# Altium footprint library con-samtec.PCBLIB: 805 footprints (part 39 of 55)
Each footprint in its own frame and in the unit in brackets; x right, y up, seen from the top. Pads: shape width x height; smd on the part's side, far side on the other; paste and mask are expansions set on the pad; w line width, h text height; cw(c..) or ccw(c..) is an arc to the next point about the centre after c.
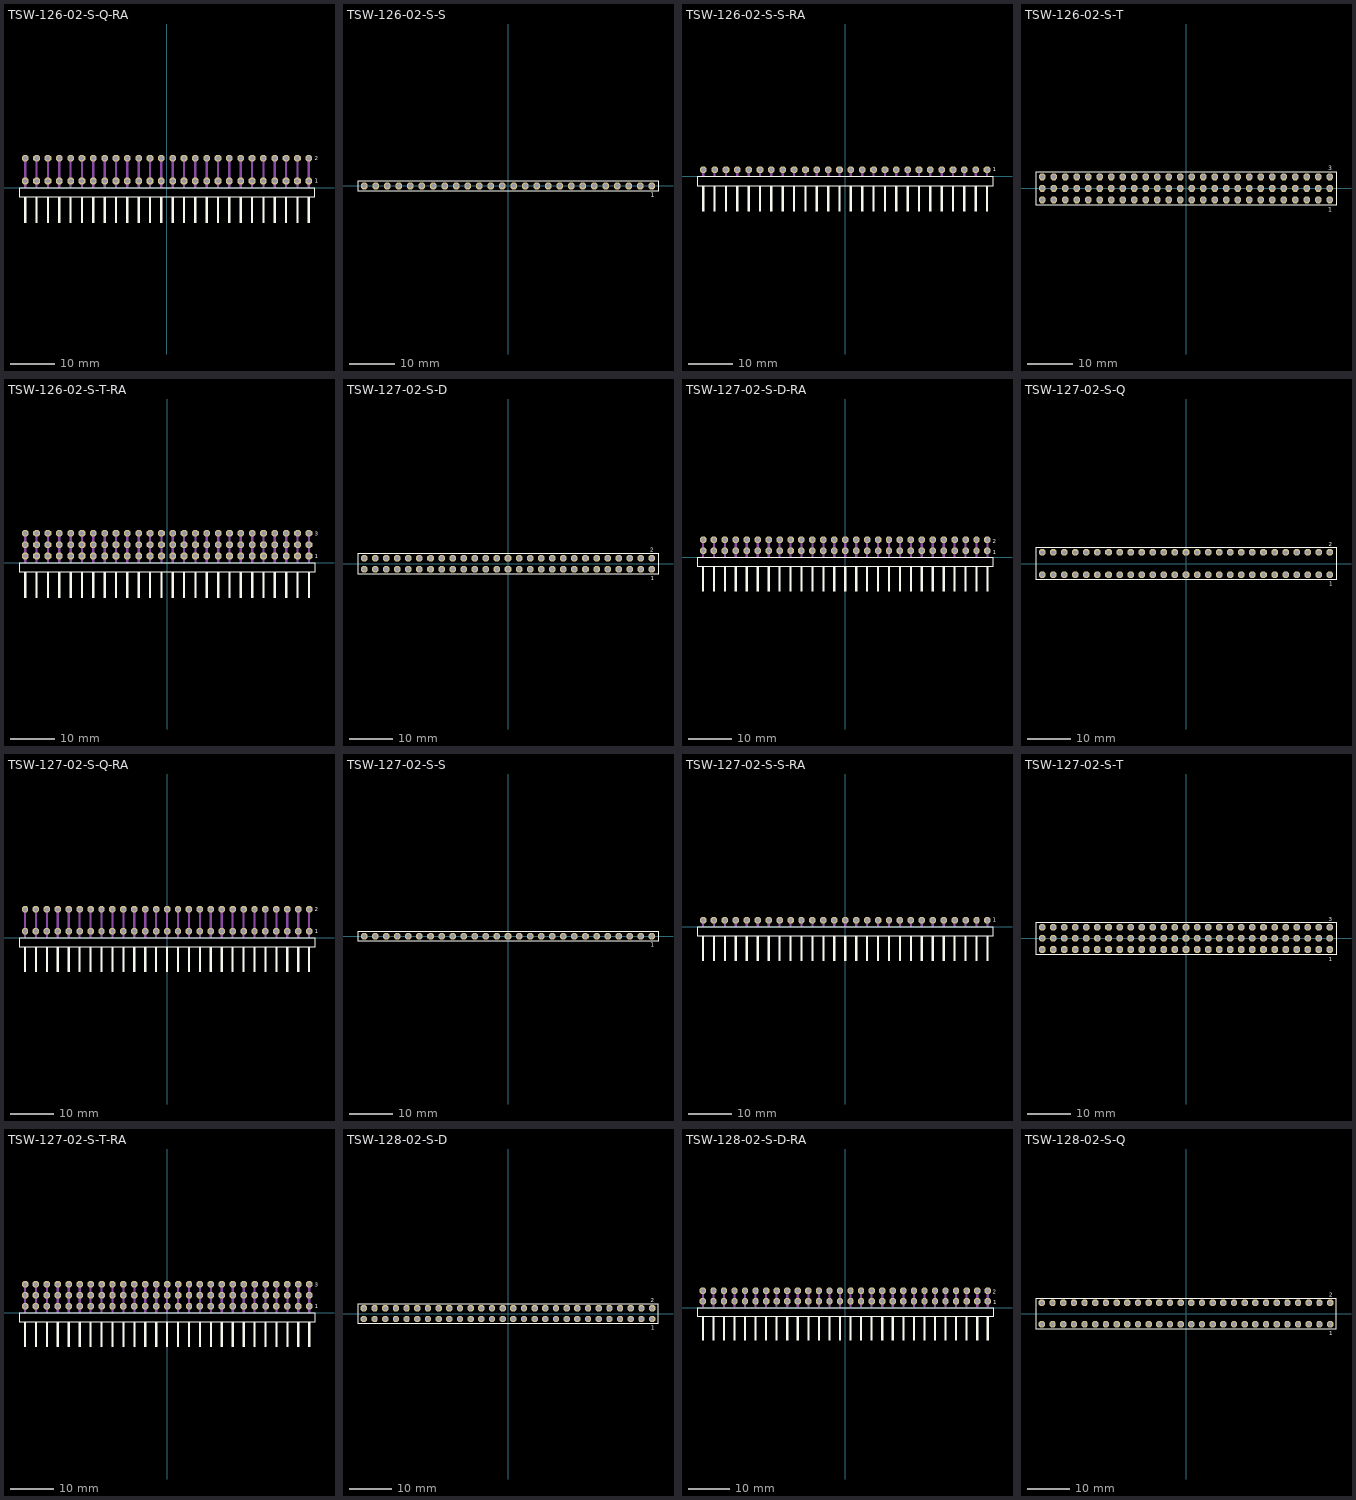
[diagram p38: the footprints below, top view; thin cyan lines are the x and y axes]

## TSW-126-02-S-Q-RA [mil]
pads (52):
  oct 59.06x59.06 hole 39.37: 1(1250,60) 2(1250,260) 3(1150,60) 4(1150,260) 5(1050,60) 6(1050,260) 7(950,60) 8(950,260) 9(850,60) 10(850,260) 11(750,60) 12(750,260) 13(650,60) 14(650,260) 15(550,60) 16(550,260) 17(450,60) 18(450,260) 19(350,60) 20(350,260) 21(250,60) 22(250,260) 23(150,60) 24(150,260) 25(50,60) 26(50,260) 27(-50,60) 28(-50,260) 29(-150,60) 30(-150,260) 31(-250,60) 32(-250,260) 33(-350,60) 34(-350,260) 35(-450,60) 36(-450,260) 37(-550,60) 38(-550,260) 39(-650,60) 40(-650,260) 41(-750,60) 42(-750,260) 43(-850,60) 44(-850,260) 45(-950,60) 46(-950,260) 47(-1050,60) 48(-1050,260) 49(-1150,60) 50(-1150,260) 51(-1250,60) 52(-1250,260)
Top Overlay:
  rectangle: -1260,-310.63 -1240,-80.32
  rectangle: -1160,-310.63 -1140,-80.32
  rectangle: -1060,-310.63 -1040,-80.32
  rectangle: -960,-310.63 -940,-80.32
  rectangle: -860,-310.63 -840,-80.32
  rectangle: -760,-310.63 -740,-80.32
  rectangle: -660,-310.63 -640,-80.32
  rectangle: -560,-310.63 -540,-80.32
  rectangle: -460,-310.63 -440,-80.32
  rectangle: -360,-310.63 -340,-80.32
  rectangle: -260,-310.63 -240,-80.32
  rectangle: -160,-310.63 -140,-80.32
  rectangle: -60,-310.63 -40,-80.32
  rectangle: 40,-310.63 60,-80.32
  rectangle: 140,-310.63 160,-80.32
  rectangle: 240,-310.63 260,-80.32
  rectangle: 340,-310.63 360,-80.32
  rectangle: 440,-310.63 460,-80.32
  rectangle: 540,-310.63 560,-80.32
  rectangle: 640,-310.63 660,-80.32
  rectangle: 740,-310.63 760,-80.32
  rectangle: 840,-310.63 860,-80.32
  rectangle: 940,-310.63 960,-80.32
  rectangle: 1040,-310.63 1060,-80.32
  rectangle: 1140,-310.63 1160,-80.32
  rectangle: 1240,-310.63 1260,-80.32
  lines w8: -1305.08,-80.55 1305.08,-80.55 1305.08,-4.17 -1305.08,-4.17 -1305.08,-80.55
  text "1" at 1303.54,43.31 h36.81
  text "2" at 1301.18,242.72 h36.81
Mechanical 16:
  rectangle: -1260,0 -1240,270
  rectangle: -1160,0 -1140,270
  rectangle: -1060,0 -1040,270
  rectangle: -960,0 -940,270
  rectangle: -860,0 -840,270
  rectangle: -760,0 -740,270
  rectangle: -660,0 -640,270
  rectangle: -560,0 -540,270
  rectangle: -460,0 -440,270
  rectangle: -360,0 -340,270
  rectangle: -260,0 -240,270
  rectangle: -160,0 -140,270
  rectangle: -60,0 -40,270
  rectangle: 40,0 60,270
  rectangle: 140,0 160,270
  rectangle: 240,0 260,270
  rectangle: 340,0 360,270
  rectangle: 440,0 460,270
  rectangle: 540,0 560,270
  rectangle: 640,0 660,270
  rectangle: 740,0 760,270
  rectangle: 840,0 860,270
  rectangle: 940,0 960,270
  rectangle: 1040,0 1060,270
  rectangle: 1140,0 1160,270
  rectangle: 1240,0 1260,270

## TSW-126-02-S-S [mm]
pads (26):
  oct 1.5x1.5 hole 1: 1(31.75,0) 2(29.21,0) 3(26.67,0) 4(24.13,0) 5(21.59,0) 6(19.05,0) 7(16.51,0) 8(13.97,0) 9(11.43,0) 10(8.89,0) 11(6.35,0) 12(3.81,0) 13(1.27,0) 14(-1.27,0) 15(-3.81,0) 16(-6.35,0) 17(-8.89,0) 18(-11.43,0) 19(-13.97,0) 20(-16.51,0) 21(-19.05,0) 22(-21.59,0) 23(-24.13,0) 24(-26.67,0) 25(-29.21,0) 26(-31.75,0)
Top Overlay:
  lines w0.203: -33.149,-1.155 33.149,-1.155 33.149,1.155 -33.149,1.155 -33.149,-1.155
  text "1" at 31.492,-2.498 h0.94
Mechanical 16:
  rectangle: -32.1,-0.35 -31.4,0.35
  rectangle: -29.56,-0.35 -28.86,0.35
  rectangle: -27.02,-0.35 -26.32,0.35
  rectangle: -24.48,-0.35 -23.78,0.35
  rectangle: -21.94,-0.35 -21.24,0.35
  rectangle: -19.4,-0.35 -18.7,0.35
  rectangle: -16.86,-0.35 -16.16,0.35
  rectangle: -14.32,-0.35 -13.62,0.35
  rectangle: -11.78,-0.35 -11.08,0.35
  rectangle: -9.24,-0.35 -8.54,0.35
  rectangle: -6.7,-0.35 -6,0.35
  rectangle: -4.16,-0.35 -3.46,0.35
  rectangle: -1.62,-0.35 -0.92,0.35
  rectangle: 0.92,-0.35 1.62,0.35
  rectangle: 3.46,-0.35 4.16,0.35
  rectangle: 6,-0.35 6.7,0.35
  rectangle: 8.54,-0.35 9.24,0.35
  rectangle: 11.08,-0.35 11.78,0.35
  rectangle: 13.62,-0.35 14.32,0.35
  rectangle: 16.16,-0.35 16.86,0.35
  rectangle: 18.7,-0.35 19.4,0.35
  rectangle: 21.24,-0.35 21.94,0.35
  rectangle: 23.78,-0.35 24.48,0.35
  rectangle: 26.32,-0.35 27.02,0.35
  rectangle: 28.86,-0.35 29.56,0.35
  rectangle: 31.4,-0.35 32.1,0.35

## TSW-126-02-S-S-RA [mil]
pads (26):
  oct 59.06x59.06 hole 39.37: 1(1250,60) 2(1150,60) 3(1050,60) 4(950,60) 5(850,60) 6(750,60) 7(650,60) 8(550,60) 9(450,60) 10(350,60) 11(250,60) 12(150,60) 13(50,60) 14(-50,60) 15(-150,60) 16(-250,60) 17(-350,60) 18(-450,60) 19(-550,60) 20(-650,60) 21(-750,60) 22(-850,60) 23(-950,60) 24(-1050,60) 25(-1150,60) 26(-1250,60)
Top Overlay:
  rectangle: -1260,-310.63 -1240,-80.32
  rectangle: -1160,-310.63 -1140,-80.32
  rectangle: -1060,-310.63 -1040,-80.32
  rectangle: -960,-310.63 -940,-80.32
  rectangle: -860,-310.63 -840,-80.32
  rectangle: -760,-310.63 -740,-80.32
  rectangle: -660,-310.63 -640,-80.32
  rectangle: -560,-310.63 -540,-80.32
  rectangle: -460,-310.63 -440,-80.32
  rectangle: -360,-310.63 -340,-80.32
  rectangle: -260,-310.63 -240,-80.32
  rectangle: -160,-310.63 -140,-80.32
  rectangle: -60,-310.63 -40,-80.32
  rectangle: 40,-310.63 60,-80.32
  rectangle: 140,-310.63 160,-80.32
  rectangle: 240,-310.63 260,-80.32
  rectangle: 340,-310.63 360,-80.32
  rectangle: 440,-310.63 460,-80.32
  rectangle: 540,-310.63 560,-80.32
  rectangle: 640,-310.63 660,-80.32
  rectangle: 740,-310.63 760,-80.32
  rectangle: 840,-310.63 860,-80.32
  rectangle: 940,-310.63 960,-80.32
  rectangle: 1040,-310.63 1060,-80.32
  rectangle: 1140,-310.63 1160,-80.32
  rectangle: 1240,-310.63 1260,-80.32
  lines w8: -1305.08,-80.55 1305.08,-80.55 1305.08,-4.17 -1305.08,-4.17 -1305.08,-80.55
  text "1" at 1300.47,45.35 h36.81
Mechanical 16:
  rectangle: -1260,0 -1240,70
  rectangle: -1160,0 -1140,70
  rectangle: -1060,0 -1040,70
  rectangle: -960,0 -940,70
  rectangle: -860,0 -840,70
  rectangle: -760,0 -740,70
  rectangle: -660,0 -640,70
  rectangle: -560,0 -540,70
  rectangle: -460,0 -440,70
  rectangle: -360,0 -340,70
  rectangle: -260,0 -240,70
  rectangle: -160,0 -140,70
  rectangle: -60,0 -40,70
  rectangle: 40,0 60,70
  rectangle: 140,0 160,70
  rectangle: 240,0 260,70
  rectangle: 340,0 360,70
  rectangle: 440,0 460,70
  rectangle: 540,0 560,70
  rectangle: 640,0 660,70
  rectangle: 740,0 760,70
  rectangle: 840,0 860,70
  rectangle: 940,0 960,70
  rectangle: 1040,0 1060,70
  rectangle: 1140,0 1160,70
  rectangle: 1240,0 1260,70

## TSW-126-02-S-T [mm]
pads (78):
  oct 1.5x1.5 hole 1: 1(31.75,-2.54) 2(31.75,0) 3(31.75,2.54) 4(29.21,-2.54) 5(29.21,0) 6(29.21,2.54) 7(26.67,-2.54) 8(26.67,0) 9(26.67,2.54) 10(24.13,-2.54) 11(24.13,0) 12(24.13,2.54) 13(21.59,-2.54) 14(21.59,0) 15(21.59,2.54) 16(19.05,-2.54) 17(19.05,0) 18(19.05,2.54) 19(16.51,-2.54) 20(16.51,0) 21(16.51,2.54) 22(13.97,-2.54) 23(13.97,0) 24(13.97,2.54) 25(11.43,-2.54) 26(11.43,0) 27(11.43,2.54) 28(8.89,-2.54) 29(8.89,0) 30(8.89,2.54) 31(6.35,-2.54) 32(6.35,0) 33(6.35,2.54) 34(3.81,-2.54) 35(3.81,0) 36(3.81,2.54) 37(1.27,-2.54) 38(1.27,0) 39(1.27,2.54) 40(-1.27,-2.54) 41(-1.27,0) 42(-1.27,2.54) 43(-3.81,-2.54) 44(-3.81,0) 45(-3.81,2.54) 46(-6.35,-2.54) 47(-6.35,0) 48(-6.35,2.54) 49(-8.89,-2.54) 50(-8.89,0) 51(-8.89,2.54) 52(-11.43,-2.54) 53(-11.43,0) 54(-11.43,2.54) 55(-13.97,-2.54) 56(-13.97,0) 57(-13.97,2.54) 58(-16.51,-2.54) 59(-16.51,0) 60(-16.51,2.54) 61(-19.05,-2.54) 62(-19.05,0) 63(-19.05,2.54) 64(-21.59,-2.54) 65(-21.59,0) 66(-21.59,2.54) 67(-24.13,-2.54) 68(-24.13,0) 69(-24.13,2.54) 70(-26.67,-2.54) 71(-26.67,0) 72(-26.67,2.54) 73(-29.21,-2.54) 74(-29.21,0) 75(-29.21,2.54) 76(-31.75,-2.54) 77(-31.75,0) 78(-31.75,2.54)
Top Overlay:
  lines w0.203: -33.149,-3.695 33.149,-3.695 33.149,3.695 -33.149,3.695 -33.149,-3.695
  text "1" at 31.442,-5.188 h0.94
  text "3" at 31.438,3.989 h0.94
Mechanical 16:
  rectangle: -29.56,-2.89 -28.86,-2.19
  rectangle: -29.56,-0.35 -28.86,0.35
  rectangle: -29.56,2.19 -28.86,2.89
  rectangle: -27.02,-2.89 -26.32,-2.19
  rectangle: -27.02,-0.35 -26.32,0.35
  rectangle: -27.02,2.19 -26.32,2.89
  rectangle: -24.48,-2.89 -23.78,-2.19
  rectangle: -24.48,-0.35 -23.78,0.35
  rectangle: -24.48,2.19 -23.78,2.89
  rectangle: -21.94,-2.89 -21.24,-2.19
  rectangle: -21.94,-0.35 -21.24,0.35
  rectangle: -21.94,2.19 -21.24,2.89
  rectangle: -19.4,-2.89 -18.7,-2.19
  rectangle: -19.4,-0.35 -18.7,0.35
  rectangle: -19.4,2.19 -18.7,2.89
  rectangle: -16.86,-2.89 -16.16,-2.19
  rectangle: -16.86,-0.35 -16.16,0.35
  rectangle: -16.86,2.19 -16.16,2.89
  rectangle: -14.32,-2.89 -13.62,-2.19
  rectangle: -14.32,-0.35 -13.62,0.35
  rectangle: -14.32,2.19 -13.62,2.89
  rectangle: -11.78,-2.89 -11.08,-2.19
  rectangle: -11.78,-0.35 -11.08,0.35
  rectangle: -11.78,2.19 -11.08,2.89
  rectangle: -9.24,-2.89 -8.54,-2.19
  rectangle: -9.24,-0.35 -8.54,0.35
  rectangle: -9.24,2.19 -8.54,2.89
  rectangle: -6.7,-2.89 -6,-2.19
  rectangle: -6.7,-0.35 -6,0.35
  rectangle: -6.7,2.19 -6,2.89
  rectangle: -4.16,-2.89 -3.46,-2.19
  rectangle: -4.16,-0.35 -3.46,0.35
  rectangle: -4.16,2.19 -3.46,2.89
  rectangle: -1.62,-2.89 -0.92,-2.19
  rectangle: -1.62,-0.35 -0.92,0.35
  rectangle: -1.62,2.19 -0.92,2.89
  rectangle: 0.92,-2.89 1.62,-2.19
  rectangle: 0.92,-0.35 1.62,0.35
  rectangle: 0.92,2.19 1.62,2.89
  rectangle: 3.46,-2.89 4.16,-2.19
  rectangle: 3.46,-0.35 4.16,0.35
  rectangle: 3.46,2.19 4.16,2.89
  rectangle: 6,-2.89 6.7,-2.19
  rectangle: 6,-0.35 6.7,0.35
  rectangle: 6,2.19 6.7,2.89
  rectangle: 8.54,-2.89 9.24,-2.19
  rectangle: 8.54,-0.35 9.24,0.35
  rectangle: 8.54,2.19 9.24,2.89
  rectangle: 11.08,-2.89 11.78,-2.19
  rectangle: 11.08,-0.35 11.78,0.35
  rectangle: 11.08,2.19 11.78,2.89
  rectangle: 13.62,-2.89 14.32,-2.19
  rectangle: 13.62,-0.35 14.32,0.35
  rectangle: 13.62,2.19 14.32,2.89
  rectangle: 16.16,-2.89 16.86,-2.19
  rectangle: 16.16,-0.35 16.86,0.35
  rectangle: 16.16,2.19 16.86,2.89
  rectangle: 18.7,-2.89 19.4,-2.19
  rectangle: 18.7,-0.35 19.4,0.35
  rectangle: 18.7,2.19 19.4,2.89
  rectangle: 21.24,-2.89 21.94,-2.19
  rectangle: 21.24,-0.35 21.94,0.35
  rectangle: 21.24,2.19 21.94,2.89
  rectangle: 23.78,-2.89 24.48,-2.19
  rectangle: 23.78,-0.35 24.48,0.35
  rectangle: 23.78,2.19 24.48,2.89
  rectangle: 26.32,-2.89 27.02,-2.19
  rectangle: 26.32,-0.35 27.02,0.35
  rectangle: 26.32,2.19 27.02,2.89
  rectangle: 28.86,-2.89 29.56,-2.19
  rectangle: 28.86,-0.35 29.56,0.35
  rectangle: 28.86,2.19 29.56,2.89
  rectangle: 31.4,-2.89 32.1,-2.19
  rectangle: 31.4,-0.35 32.1,0.35
  rectangle: 31.4,2.19 32.1,2.89
  rectangle: -32.1,2.19 -31.4,2.89
  rectangle: -32.1,-0.35 -31.4,0.35
  rectangle: -32.1,-2.89 -31.4,-2.19

## TSW-126-02-S-T-RA [mil]
pads (78):
  oct 59.06x59.06 hole 39.37: 1(1250,60) 2(1250,160) 3(1250,260) 4(1150,60) 5(1150,160) 6(1150,260) 7(1050,60) 8(1050,160) 9(1050,260) 10(950,60) 11(950,160) 12(950,260) 13(850,60) 14(850,160) 15(850,260) 16(750,60) 17(750,160) 18(750,260) 19(650,60) 20(650,160) 21(650,260) 22(550,60) 23(550,160) 24(550,260) 25(450,60) 26(450,160) 27(450,260) 28(350,60) 29(350,160) 30(350,260) 31(250,60) 32(250,160) 33(250,260) 34(150,60) 35(150,160) 36(150,260) 37(50,60) 38(50,160) 39(50,260) 40(-50,60) 41(-50,160) 42(-50,260) 43(-150,60) 44(-150,160) 45(-150,260) 46(-250,60) 47(-250,160) 48(-250,260) 49(-350,60) 50(-350,160) 51(-350,260) 52(-450,60) 53(-450,160) 54(-450,260) 55(-550,60) 56(-550,160) 57(-550,260) 58(-650,60) 59(-650,160) 60(-650,260) 61(-750,60) 62(-750,160) 63(-750,260) 64(-850,60) 65(-850,160) 66(-850,260) 67(-950,60) 68(-950,160) 69(-950,260) 70(-1050,60) 71(-1050,160) 72(-1050,260) 73(-1150,60) 74(-1150,160) 75(-1150,260) 76(-1250,60) 77(-1250,160) 78(-1250,260)
Top Overlay:
  rectangle: -1260,-310.63 -1240,-80.32
  rectangle: -1160,-310.63 -1140,-80.32
  rectangle: -1060,-310.63 -1040,-80.32
  rectangle: -960,-310.63 -940,-80.32
  rectangle: -860,-310.63 -840,-80.32
  rectangle: -760,-310.63 -740,-80.32
  rectangle: -660,-310.63 -640,-80.32
  rectangle: -560,-310.63 -540,-80.32
  rectangle: -460,-310.63 -440,-80.32
  rectangle: -360,-310.63 -340,-80.32
  rectangle: -260,-310.63 -240,-80.32
  rectangle: -160,-310.63 -140,-80.32
  rectangle: -60,-310.63 -40,-80.32
  rectangle: 40,-310.63 60,-80.32
  rectangle: 140,-310.63 160,-80.32
  rectangle: 240,-310.63 260,-80.32
  rectangle: 340,-310.63 360,-80.32
  rectangle: 440,-310.63 460,-80.32
  rectangle: 540,-310.63 560,-80.32
  rectangle: 640,-310.63 660,-80.32
  rectangle: 740,-310.63 760,-80.32
  rectangle: 840,-310.63 860,-80.32
  rectangle: 940,-310.63 960,-80.32
  rectangle: 1040,-310.63 1060,-80.32
  rectangle: 1140,-310.63 1160,-80.32
  rectangle: 1240,-310.63 1260,-80.32
  lines w8: -1305.08,-80.55 1305.08,-80.55 1305.08,-4.17 -1305.08,-4.17 -1305.08,-80.55
  text "1" at 1301.57,41.34 h36.81
  text "3" at 1302.17,236.81 h36.81
Mechanical 16:
  rectangle: -1260,0 -1240,270
  rectangle: -1160,0 -1140,270
  rectangle: -1060,0 -1040,270
  rectangle: -960,0 -940,270
  rectangle: -860,0 -840,270
  rectangle: -760,0 -740,270
  rectangle: -660,0 -640,270
  rectangle: -560,0 -540,270
  rectangle: -460,0 -440,270
  rectangle: -360,0 -340,270
  rectangle: -260,0 -240,270
  rectangle: -160,0 -140,270
  rectangle: -60,0 -40,270
  rectangle: 40,0 60,270
  rectangle: 140,0 160,270
  rectangle: 240,0 260,270
  rectangle: 340,0 360,270
  rectangle: 440,0 460,270
  rectangle: 540,0 560,270
  rectangle: 640,0 660,270
  rectangle: 740,0 760,270
  rectangle: 840,0 860,270
  rectangle: 940,0 960,270
  rectangle: 1040,0 1060,270
  rectangle: 1140,0 1160,270
  rectangle: 1240,0 1260,270

## TSW-127-02-S-D [mm]
pads (54):
  oct 1.5x1.5 hole 1: 1(33.02,-1.27) 2(33.02,1.27) 3(30.48,-1.27) 4(30.48,1.27) 5(27.94,-1.27) 6(27.94,1.27) 7(25.4,-1.27) 8(25.4,1.27) 9(22.86,-1.27) 10(22.86,1.27) 11(20.32,-1.27) 12(20.32,1.27) 13(17.78,-1.27) 14(17.78,1.27) 15(15.24,-1.27) 16(15.24,1.27) 17(12.7,-1.27) 18(12.7,1.27) 19(10.16,-1.27) 20(10.16,1.27) 21(7.62,-1.27) 22(7.62,1.27) 23(5.08,-1.27) 24(5.08,1.27) 25(2.54,-1.27) 26(2.54,1.27) 27(0,-1.27) 28(0,1.27) 29(-2.54,-1.27) 30(-2.54,1.27) 31(-5.08,-1.27) 32(-5.08,1.27) 33(-7.62,-1.27) 34(-7.62,1.27) 35(-10.16,-1.27) 36(-10.16,1.27) 37(-12.7,-1.27) 38(-12.7,1.27) 39(-15.24,-1.27) 40(-15.24,1.27) 41(-17.78,-1.27) 42(-17.78,1.27) 43(-20.32,-1.27) 44(-20.32,1.27) 45(-22.86,-1.27) 46(-22.86,1.27) 47(-25.4,-1.27) 48(-25.4,1.27) 49(-27.94,-1.27) 50(-27.94,1.27) 51(-30.48,-1.27) 52(-30.48,1.27) 53(-33.02,-1.27) 54(-33.02,1.27)
Top Overlay:
  lines w0.203: -34.419,-2.425 34.419,-2.425 34.419,2.425 -34.419,2.425 -34.419,-2.425
  text "1" at 32.812,-3.818 h0.94
  text "2" at 32.637,2.744 h0.94
Mechanical 16:
  rectangle: -33.37,-1.62 -32.67,-0.92
  rectangle: -33.37,0.92 -32.67,1.62
  rectangle: -30.83,-1.62 -30.13,-0.92
  rectangle: -30.83,0.92 -30.13,1.62
  rectangle: -28.29,-1.62 -27.59,-0.92
  rectangle: -28.29,0.92 -27.59,1.62
  rectangle: -25.75,-1.62 -25.05,-0.92
  rectangle: -25.75,0.92 -25.05,1.62
  rectangle: -23.21,-1.62 -22.51,-0.92
  rectangle: -23.21,0.92 -22.51,1.62
  rectangle: -20.67,-1.62 -19.97,-0.92
  rectangle: -20.67,0.92 -19.97,1.62
  rectangle: -18.13,-1.62 -17.43,-0.92
  rectangle: -18.13,0.92 -17.43,1.62
  rectangle: -15.59,-1.62 -14.89,-0.92
  rectangle: -15.59,0.92 -14.89,1.62
  rectangle: -13.05,-1.62 -12.35,-0.92
  rectangle: -13.05,0.92 -12.35,1.62
  rectangle: -10.51,-1.62 -9.81,-0.92
  rectangle: -10.51,0.92 -9.81,1.62
  rectangle: -7.97,-1.62 -7.27,-0.92
  rectangle: -7.97,0.92 -7.27,1.62
  rectangle: -5.43,-1.62 -4.73,-0.92
  rectangle: -5.43,0.92 -4.73,1.62
  rectangle: -2.89,-1.62 -2.19,-0.92
  rectangle: -2.89,0.92 -2.19,1.62
  rectangle: -0.35,-1.62 0.35,-0.92
  rectangle: -0.35,0.92 0.35,1.62
  rectangle: 2.19,-1.62 2.89,-0.92
  rectangle: 2.19,0.92 2.89,1.62
  rectangle: 4.73,-1.62 5.43,-0.92
  rectangle: 4.73,0.92 5.43,1.62
  rectangle: 7.27,-1.62 7.97,-0.92
  rectangle: 7.27,0.92 7.97,1.62
  rectangle: 9.81,-1.62 10.51,-0.92
  rectangle: 9.81,0.92 10.51,1.62
  rectangle: 12.35,-1.62 13.05,-0.92
  rectangle: 12.35,0.92 13.05,1.62
  rectangle: 14.89,-1.62 15.59,-0.92
  rectangle: 14.89,0.92 15.59,1.62
  rectangle: 17.43,-1.62 18.13,-0.92
  rectangle: 17.43,0.92 18.13,1.62
  rectangle: 19.97,-1.62 20.67,-0.92
  rectangle: 19.97,0.92 20.67,1.62
  rectangle: 22.51,-1.62 23.21,-0.92
  rectangle: 22.51,0.92 23.21,1.62
  rectangle: 25.05,-1.62 25.75,-0.92
  rectangle: 25.05,0.92 25.75,1.62
  rectangle: 27.59,-1.62 28.29,-0.92
  rectangle: 27.59,0.92 28.29,1.62
  rectangle: 30.13,-1.62 30.83,-0.92
  rectangle: 30.13,0.92 30.83,1.62
  rectangle: 32.67,-1.62 33.37,-0.92
  rectangle: 32.67,0.92 33.37,1.62

## TSW-127-02-S-D-RA [mil]
pads (54):
  oct 59.06x59.06 hole 39.37: 1(1300,60) 2(1300,160) 3(1200,60) 4(1200,160) 5(1100,60) 6(1100,160) 7(1000,60) 8(1000,160) 9(900,60) 10(900,160) 11(800,60) 12(800,160) 13(700,60) 14(700,160) 15(600,60) 16(600,160) 17(500,60) 18(500,160) 19(400,60) 20(400,160) 21(300,60) 22(300,160) 23(200,60) 24(200,160) 25(100,60) 26(100,160) 27(0,60) 28(0,160) 29(-100,60) 30(-100,160) 31(-200,60) 32(-200,160) 33(-300,60) 34(-300,160) 35(-400,60) 36(-400,160) 37(-500,60) 38(-500,160) 39(-600,60) 40(-600,160) 41(-700,60) 42(-700,160) 43(-800,60) 44(-800,160) 45(-900,60) 46(-900,160) 47(-1000,60) 48(-1000,160) 49(-1100,60) 50(-1100,160) 51(-1200,60) 52(-1200,160) 53(-1300,60) 54(-1300,160)
Top Overlay:
  rectangle: -1310,-310.63 -1290,-80.32
  rectangle: -1210,-310.63 -1190,-80.32
  rectangle: -1110,-310.63 -1090,-80.32
  rectangle: -1010,-310.63 -990,-80.32
  rectangle: -910,-310.63 -890,-80.32
  rectangle: -810,-310.63 -790,-80.32
  rectangle: -710,-310.63 -690,-80.32
  rectangle: -610,-310.63 -590,-80.32
  rectangle: -510,-310.63 -490,-80.32
  rectangle: -410,-310.63 -390,-80.32
  rectangle: -310,-310.63 -290,-80.32
  rectangle: -210,-310.63 -190,-80.32
  rectangle: -110,-310.63 -90,-80.32
  rectangle: -10,-310.63 10,-80.32
  rectangle: 90,-310.63 110,-80.32
  rectangle: 190,-310.63 210,-80.32
  rectangle: 290,-310.63 310,-80.32
  rectangle: 390,-310.63 410,-80.32
  rectangle: 490,-310.63 510,-80.32
  rectangle: 590,-310.63 610,-80.32
  rectangle: 690,-310.63 710,-80.32
  rectangle: 790,-310.63 810,-80.32
  rectangle: 890,-310.63 910,-80.32
  rectangle: 990,-310.63 1010,-80.32
  rectangle: 1090,-310.63 1110,-80.32
  rectangle: 1190,-310.63 1210,-80.32
  rectangle: 1290,-310.63 1310,-80.32
  lines w8: -1355.08,-80.55 1355.08,-80.55 1355.08,-4.17 -1355.08,-4.17 -1355.08,-80.55
  text "1" at 1350.59,30.51 h36.81
  text "2" at 1349.21,129.53 h36.81
Mechanical 16:
  rectangle: -1310,0 -1290,170
  rectangle: -1210,0 -1190,170
  rectangle: -1110,0 -1090,170
  rectangle: -1010,0 -990,170
  rectangle: -910,0 -890,170
  rectangle: -810,0 -790,170
  rectangle: -710,0 -690,170
  rectangle: -610,0 -590,170
  rectangle: -510,0 -490,170
  rectangle: -410,0 -390,170
  rectangle: -310,0 -290,170
  rectangle: -210,0 -190,170
  rectangle: -110,0 -90,170
  rectangle: -10,0 10,170
  rectangle: 90,0 110,170
  rectangle: 190,0 210,170
  rectangle: 290,0 310,170
  rectangle: 390,0 410,170
  rectangle: 490,0 510,170
  rectangle: 590,0 610,170
  rectangle: 690,0 710,170
  rectangle: 790,0 810,170
  rectangle: 890,0 910,170
  rectangle: 990,0 1010,170
  rectangle: 1090,0 1110,170
  rectangle: 1190,0 1210,170
  rectangle: 1290,0 1310,170
